# Altium footprint library Connector.PcbLib: 174 footprints (part 1 of 11)
Each footprint in its own frame and in the unit in brackets; x right, y up, seen from the top. Pads: shape width x height; smd on the part's side, far side on the other; paste and mask are expansions set on the pad; w line width, h text height; cw(c..) or ccw(c..) is an arc to the next point about the centre after c.
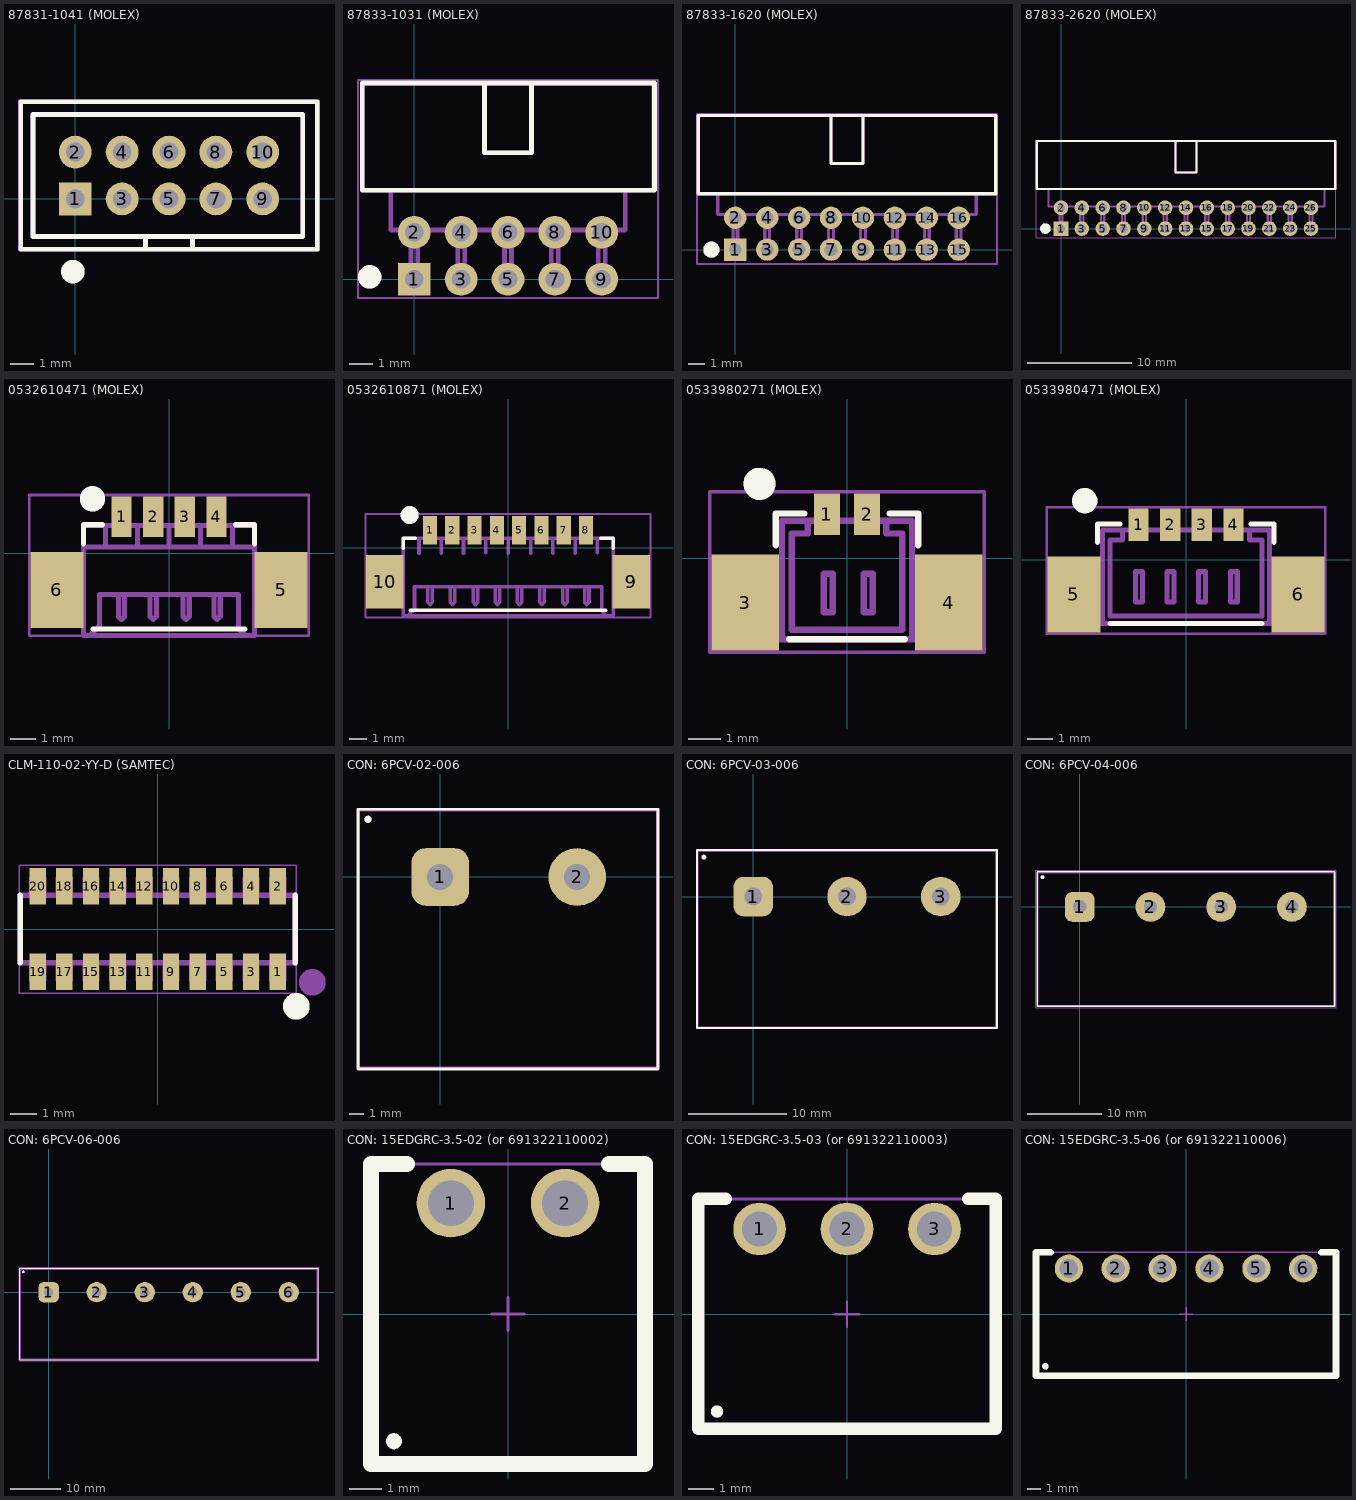
[diagram p0: the footprints below, top view; thin cyan lines are the x and y axes]

## 87831-1041 (MOLEX) [mm]
pads (10):
  rect 1.4x1.4 hole 0.8: 1(0,0)
  round 1.4 hole 0.8: 2(0,2) 3(2,0) 4(2,2) 5(4,0) 6(4,2) 7(6,0) 8(6,2) 9(8,0) 10(8,2)
Top Overlay:
  circle w0.5: c-0.1,-3.1 r0.25
  lines w0.2: 3,-2.1 3,-1.6 ; 5,-2.1 5,-1.6 ; -2.325,-2.15 10.325,-2.15 10.325,4.15 -2.325,4.15 -2.325,-2.15 ; -1.8,-1.6 -1.8,3.6 9.7,3.6 9.7,-1.6 -1.8,-1.6
Top Assy:
  circle w0.5: c-0.1,-3.1 r0.25
  lines w0.2: 3,-2.1 3,-1.6 -1.8,-1.6 -1.8,3.6 9.7,3.6 9.7,-1.6 5,-1.6 5,-2.1 ; -2.325,-2.15 -2.325,4.15 10.325,4.15 10.325,-2.15 -2.325,-2.15
  text "'.Designator'" at -2.3,4.4 h1
Area:
  lines w0.1: -2.4,-2.2 10.4,-2.2 10.4,4.2 -2.4,4.2 -2.4,-2.2
3D body "87831-1041.stp": height 6.2, standoff -2.7, extent -2.325,-2.15 10.325,4.15

## 87833-1031 (MOLEX) [mm]
pads (10):
  rect 1.4x1.4 hole 0.8: 1(0,0)
  round 1.4 hole 0.8: 2(0,2) 3(2,0) 4(2,2) 5(4,0) 6(4,2) 7(6,0) 8(6,2) 9(8,0) 10(8,2)
Top Overlay:
  circle w0.5: c-1.9,0.1 r0.25
  lines w0.2: 3,8.3 3,5.4 5,5.4 5,8.3 ; -2.225,3.8 10.25,3.8 10.25,8.375 -2.225,8.375 -2.225,3.8
Top Assy:
  circle w0.5: c-1.9,0.1 r0.25
  lines w0.2: -1,3.8 -1,2.1 9,2.1 9,3.8 ; -0.15,2.1 -0.15,0 0.15,0 0.15,2.1 ; 1.85,2.1 1.85,0 2.15,0 2.15,2.1 ; 3,8.3 3,5.4 5,5.4 5,8.3 ; 3.85,2.1 3.85,0 4.15,0 4.15,2.1 ; 5.85,2.1 5.85,0 6.15,0 6.15,2.1 ; 7.85,2.1 7.85,0 8.15,0 8.15,2.1 ; -2.225,3.8 10.225,3.8 10.225,8.375 -2.225,8.375 -2.225,3.8
  text "'.Designator'" at 1.5,4.3 h1
Area:
  lines w0.1: -2.4,-0.8 10.4,-0.8 10.4,8.5 -2.4,8.5 -2.4,-0.8
3D body "Molex 87833-1031.step": height 6.35, standoff -2.11, extent -2.325,-0.225 10.325,8.425

## 87833-1620 (MOLEX) [mm]
pads (16):
  rect 1.4x1.4 hole 0.8: 1(0,0)
  round 1.4 hole 0.8: 2(0,2) 3(2,0) 4(2,2) 5(4,0) 6(4,2) 7(6,0) 8(6,2) 9(8,0) 10(8,2) 11(10,0) 12(10,2) 13(12,0) 14(12,2) 15(14,0) 16(14,2)
Top Overlay:
  circle w0.5: c-1.5,0 r0.25
  lines w0.2: 6,8.3 6,5.4 8,5.4 8,8.3 ; -2.325,3.5 16.325,3.5 16.325,8.4 -2.325,8.4 -2.325,3.5
Top Assy:
  circle w0.5: c-1.5,0 r0.25
  lines w0.2: -1.1,3.5 -1.1,2.2 15.1,2.2 15.1,3.5 ; -0.15,2.1 -0.15,0 0.15,0 0.15,2.1 ; 1.85,2.1 1.85,0 2.15,0 2.15,2.1 ; 3.85,2.1 3.85,0 4.15,0 4.15,2.1 ; 5.85,2.1 5.85,0 6.15,0 6.15,2.1 ; 6,8.4 6,5.4 8,5.4 8,8.4 ; 7.85,2.1 7.85,0 8.15,0 8.15,2.1 ; 9.85,2.1 9.85,0 10.15,0 10.15,2.1 ; 11.85,2.1 11.85,0 12.15,0 12.15,2.1 ; 13.85,2.1 13.85,0 14.15,0 14.15,2.1 ; -2.325,3.5 -2.325,8.4 16.325,8.4 16.325,3.5 -2.325,3.5
  text "'.Designator'" at 4.6,3.9 h1
Area:
  lines w0.1: -2.4,-0.9 16.4,-0.9 16.4,8.5 -2.4,8.5 -2.4,-0.9
3D body "87833-1620.stp": height 6.25, standoff -2.21, extent -2.325,-0.32 16.325,8.33

## 87833-2620 (MOLEX) [mm]
pads (26):
  rect 1.4x1.4 hole 0.8: 1(0,0)
  round 1.4 hole 0.8: 2(0,2) 3(2,0) 4(2,2) 5(4,0) 6(4,2) 7(6,0) 8(6,2) 9(8,0) 10(8,2) 11(10,0) 12(10,2) 13(12,0) 14(12,2) 15(14,0) 16(14,2) 17(16,0) 18(16,2) 19(18,0) 20(18,2) 21(20,0) 22(20,2) 23(22,0) 24(22,2) 25(24,0) 26(24,2)
Top Overlay:
  circle w0.5: c-1.5,0 r0.25
  lines w0.2: 11,8.4 11,5.4 13,5.4 13,8.4 ; -2.325,3.8 -2.325,8.4 26.325,8.4 26.325,3.8 -2.325,3.8
Top Assy:
  circle w0.5: c-1.5,0 r0.25
  lines w0.2: -1.2,3.8 -1.2,2.1 25.3,2.1 25.3,3.8 ; -0.15,2.1 -0.15,0 0.15,0 0.15,2.1 ; 1.85,2.1 1.85,0 2.15,0 2.15,2.1 ; 3.85,2.1 3.85,0 4.15,0 4.15,2.1 ; 5.85,2.1 5.85,0 6.15,0 6.15,2.1 ; 7.85,2.1 7.85,0 8.15,0 8.15,2.1 ; 9.85,2.1 9.85,0 10.15,0 10.15,2.1 ; 11,8.3 11,5.4 13,5.4 13,8.3 ; 11.85,2.1 11.85,0 12.15,0 12.15,2.1 ; 13.85,2.1 13.85,0 14.15,0 14.15,2.1 ; 15.85,2.1 15.85,0 16.15,0 16.15,2.1 ; 17.85,2.1 17.85,0 18.15,0 18.15,2.1 ; 19.85,2.1 19.85,0 20.15,0 20.15,2.1 ; 21.85,2.1 21.85,0 22.15,0 22.15,2.1 ; 23.85,2.1 23.85,0 24.15,0 24.15,2.1 ; -2.325,3.8 26.325,3.8 26.325,8.4 -2.325,8.4 -2.325,3.8
  text "'.Designator'" at 9.6,4.2 h1
Area:
  lines w0.05: -2.4,-0.9 -2.4,8.5 26.4,8.5 26.4,-0.9 -2.4,-0.9
3D body "Molex 87833-2620.step": height 6.35, standoff -2.11, extent -2.325,-0.25 26.325,8.4

## 0532610471 (MOLEX) [mm] "1.25mm Pitch, PicoBlade PCB Header, Single Row, Horizontal, Surface Mount, Tin (Sn) Plating, Friction Lock, 4 Circuits"
pads (6):
  rect 0.8x1.6 smd: 1(-1.875,1.45) 2(-0.625,1.45) 3(0.625,1.45) 4(1.875,1.45)
  rect 2.1x3 smd: 5(4.425,-1.45) 6(-4.425,-1.45)
Top Overlay:
  circle w0.5: c-3.025,2.15 r0.25
  lines w0.2: -3.375,0.375 -3.375,1.125 -2.625,1.125 ; -3,-3 3,-3 ; 2.625,1.125 3.375,1.125 3.375,0.375
Top Assy:
  circle w0.5: c-3.025,2.15 r0.25
  lines w0.2: -3.4,-2.75 -5,-2.75 -5,-0.15 -3.4,-0.15 ; -3.375,0.25 3.375,0.25 ; -3.125,-3.25 -2.75,-2.875 -2.75,-1.625 2.75,-1.625 2.75,-2.875 2.75,-3 3,-3.25 ; -2.5,0.275 -2.5,1.1 ; -2.125,1.125 -2.125,1.825 -1.625,1.825 -1.625,1.125 ; -2,-1.65 -2,-2.5 -1.875,-2.625 -1.75,-2.5 -1.75,-1.65 ; -1.25,0.25 -1.25,1.075 ; -0.875,1.1 -0.875,1.8 -0.375,1.8 -0.375,1.1 ; -0.75,-1.65 -0.75,-2.5 -0.625,-2.625 -0.5,-2.5 -0.5,-1.65 ; 0,0.25 0,1.1 ; 0.375,1.1 0.375,1.8 0.875,1.8 0.875,1.1 ; 0.55,-1.65 0.55,-2.5 0.675,-2.625 0.8,-2.5 0.8,-1.65 ; 1.25,0.276 1.25,1.1 ; 1.625,1.1 1.625,1.8 2.125,1.8 2.125,1.1 ; 1.775,-1.65 1.775,-2.5 1.9,-2.625 2.025,-2.5 2.025,-1.65 ; 2.5,0.275 2.5,1.075 ; 3.375,-2.75 4.975,-2.75 4.975,-0.15 3.375,-0.15 ; -3.375,-3.25 3.375,-3.25 3.375,1.1 -3.375,1.1 -3.375,-3.25
  text "'.Designator'" at -0.9,-1.2 h1
Area:
  lines w0.1: -5.525,-3.25 -5.525,2.3 5.525,2.3 5.525,-3.25 -5.525,-3.25
3D body "53261-0471.stp": height 3.4, standoff 0, extent -5.1,-3.325 5.05,1.875

## 0532610871 (MOLEX) [mm] "1.25mm Pitch, PicoBlade PCB Header, Single Row, Horizontal, Surface Mount, Tin (Sn) Plating, Friction Lock, 8 Circuits"
pads (10):
  rect 0.8x1.6 smd: 1(-4.375,1.004) 2(-3.125,1.004) 3(-1.875,1.004) 4(-0.625,1.004) 5(0.625,1.004) 6(1.875,1.004) 7(3.125,1.004) 8(4.375,1.004)
  rect 2.1x3 smd: 9(6.925,-1.896) 10(-6.925,-1.896)
Top Overlay:
  circle w0.5: c-5.525,1.85 r0.25
  lines w0.2: -5.884,0 -5.884,0.547 -5.203,0.547 ; -5.5,-3.5 5.5,-3.5 ; 5.204,0.554 5.9,0.554 5.9,0
Top Assy:
  circle w0.5: c-5.525,1.85 r0.25
  circle w0.5: c-5.525,1.85 r0.25
  lines w0.2: -5.9,-3.007 -7.5,-3.007 -7.5,-0.8 -5.9,-0.8 ; -5.625,-3.8 -5.25,-3.425 -5.25,-2.175 5.275,-2.175 5.275,-3.55 5.525,-3.8 ; -5,-0.3 -5,0.55 ; -4.625,0.575 -4.625,1.275 -4.125,1.275 -4.125,0.575 ; -4.5,-2.2 -4.5,-3.05 -4.375,-3.175 -4.25,-3.05 -4.25,-2.2 ; -3.75,-0.3 -3.75,0.525 ; -3.375,0.55 -3.375,1.25 -2.875,1.25 -2.875,0.55 ; -3.25,-2.2 -3.25,-3.05 -3.125,-3.175 -3,-3.05 -3,-2.2 ; -2.5,-0.3 -2.5,0.55 ; -2.125,0.55 -2.125,1.25 -1.625,1.25 -1.625,0.55 ; -1.95,-2.2 -1.95,-3.05 -1.825,-3.175 -1.7,-3.05 -1.7,-2.2 ; -1.25,-0.275 -1.25,0.55 ; -0.875,0.55 -0.875,1.25 -0.375,1.25 -0.375,0.55 ; -0.725,-2.2 -0.725,-3.05 -0.6,-3.175 -0.475,-3.05 -0.475,-2.2 ; 0.025,-0.3 0.025,0.55 ; 0.4,0.575 0.4,1.275 0.9,1.275 0.9,0.575 ; 0.525,-2.2 0.525,-3.05 0.65,-3.175 0.775,-3.05 0.775,-2.2 ; 1.275,-0.3 1.275,0.525 ; 1.65,0.55 1.65,1.25 2.15,1.25 2.15,0.55 ; 1.775,-2.2 1.775,-3.05 1.9,-3.175 2.025,-3.05 2.025,-2.2 ; 2.525,-0.3 2.525,0.55 ; 2.9,0.55 2.9,1.25 3.4,1.25 3.4,0.55 ; 3.075,-2.2 3.075,-3.05 3.2,-3.175 3.325,-3.05 3.325,-2.2 ; 3.775,-0.3 3.775,0.55 ; 4.15,0.55 4.15,1.25 4.65,1.25 4.65,0.55 ; 4.3,-2.2 4.3,-3.05 4.425,-3.175 4.55,-3.05 4.55,-2.2 ; 5.025,-0.275 5.025,0.525 ; 5.9,-3.008 7.5,-3.008 7.5,-0.8 5.9,-0.8 ; -5.875,-3.8 -5.875,0.55 5.9,0.55 5.9,-3.8 -5.875,-3.8
  text "'.Designator'" at -0.9,-1.5 h1
Area:
  lines w0.1: -8,-3.9 -8,1.913 8,1.913 8,-3.9 -8,-3.9
3D body "0532610871.stp": height 3.4, standoff 0, extent -7.575,-3.895 7.575,1.305

## 0533980271 (MOLEX) [mm] "1.25mm Pitch, PicoBlade PCB Header, Single Row, Vertical, Surface Mount, Tin (Sn) Plating, Friction Lock, 2 Circuits"
pads (4):
  rect 0.8x1.3 smd: 1(-0.625,1.375) 2(0.625,1.375)
  rect 2.1x3 smd: 3(-3.175,-1.375) 4(3.175,-1.375)
Top Overlay:
  circle w0.5: c-2.725,2.325 r0.25
  lines w0.2: -2.225,0.414 -2.225,1.4 -1.337,1.4 ; -1.8,-2.525 1.8,-2.525 ; 1.337,1.4 2.225,1.4 2.225,0.414
Top Assy:
  circle w0.5: c-2.725,2.325 r0.25
  lines w0.2: -3.625,-0.15 -3.625,-2.525 -2.025,-2.525 ; -3.625,-0.1 -2.025,-0.1 ; -1.225,1.175 -1.225,0.775 -1.725,0.775 -1.725,-2.225 1.725,-2.225 1.725,0.775 1.225,0.775 1.225,1.175 ; -0.875,1.175 -0.875,1.875 -0.375,1.875 -0.375,1.175 ; 0.4,1.175 0.4,1.875 0.85,1.875 0.85,1.175 ; 2.025,-0.1 3.6,-0.1 3.6,-2.525 2.025,-2.525 ; -2.025,-2.525 -2.025,1.175 2.025,1.175 2.025,-2.525 ; -2.025,-2.525 2.025,-2.525 ; -0.725,-1.675 -0.725,-0.475 -0.45,-0.475 -0.45,-1.675 -0.725,-1.675 ; 0.525,-1.675 0.525,-0.475 0.8,-0.475 0.8,-1.675 0.525,-1.675
  text "'.Designator'" at -2,-3.825 h1
Area:
  lines w0.1: -4.275,-2.925 -4.275,2.075 4.275,2.075 4.275,-2.925 -4.275,-2.925
3D body "0533980271.stp": height 4.7, standoff 0, extent -3.825,-2.435 3.825,1.765

## 0533980471 (MOLEX) [mm] "1.25mm Pitch, PicoBlade PCB Header, Single Row, Vertical, Surface Mount, Tin (Sn) Plating, Friction Lock, 4 Circuits"
pads (6):
  rect 0.8x1.3 smd: 1(-1.875,1.375) 2(-0.625,1.375) 3(0.625,1.375) 4(1.875,1.375)
  rect 2.1x3 smd: 5(-4.425,-1.375) 6(4.425,-1.375)
Top Overlay:
  circle w0.5: c-4,2.325 r0.25
  lines w0.2: -3.5,0.675 -3.5,1.4 -2.6,1.4 ; -3,-2.525 3,-2.525 ; 2.575,1.4 3.475,1.4 3.475,0.675
Top Assy:
  circle w0.5: c-4,2.325 r0.25
  lines w0.2: -2.5,1.175 -2.5,0.775 -3,0.775 -3,-2.225 3,-2.225 3,0.775 2.5,0.775 2.5,1.175 ; -2.1,1.175 -2.1,1.875 -1.6,1.875 -1.6,1.175 ; -0.85,1.175 -0.85,1.875 -0.35,1.875 -0.35,1.175 ; 0.4,1.175 0.4,1.875 0.9,1.875 0.9,1.175 ; 1.65,1.175 1.65,1.875 2.15,1.875 2.15,1.175 ; 3.3,-2.525 3.3,-0.1 4.875,-0.1 4.875,-2.525 -3.3,-2.525 ; 3.3,-0.95 3.3,1.175 -3.3,1.175 -3.3,-2.525 ; -3.3,-2.525 -3.3,-0.1 -4.9,-0.1 -4.9,-2.525 -3.3,-2.525 ; -2,-1.675 -2,-0.475 -1.725,-0.475 -1.725,-1.675 -2,-1.675 ; -0.75,-1.675 -0.475,-1.675 -0.475,-0.475 -0.75,-0.475 -0.75,-1.675 ; 0.5,-1.675 0.775,-1.675 0.775,-0.475 0.5,-0.475 0.5,-1.675 ; 1.75,-1.675 2.025,-1.675 2.025,-0.475 1.75,-0.475 1.75,-1.675
  text "'.Designator'" at -2,-3.825 h1
Area:
  lines w0.1: -5.5,-2.925 -5.5,2.075 5.5,2.075 5.5,-2.925 -5.5,-2.925
3D body "53398-0471.stp": height 4.7, standoff 0, extent -5.075,-2.6 5.075,1.6

## CLM-110-02-YY-D (SAMTEC) [mm]
pads (20):
  rect 0.61x1.37 smd: 1(4.5,-1.601) 2(4.5,1.601) 3(3.5,-1.601) 4(3.5,1.601) 5(2.5,-1.601) 6(2.5,1.601) 7(1.5,-1.601) 8(1.5,1.601) 9(0.5,-1.601) 10(0.5,1.601) 11(-0.5,-1.601) 12(-0.5,1.601) 13(-1.5,-1.601) 14(-1.5,1.601) 15(-2.5,-1.601) 16(-2.5,1.601) 17(-3.5,-1.601) 18(-3.5,1.601) 19(-4.5,-1.601) 20(-4.5,1.601)
Top Overlay:
  circle w0.5: c5.2,-2.9 r0.25
  lines w0.2: -5.159,-1.27 -5.159,1.27 ; 5.159,-1.27 5.159,1.27
Top Assy:
  circle w0.5: c5.8,-2 r0.25
  lines w0.2: -5.159,-1.27 5.159,-1.27 5.159,1.27 -5.159,1.27 -5.159,-1.27
  lines w0.254: -4.7,-1.3 -4.7,-1.9 -4.3,-1.9 -4.3,-1.3 ; -4.7,1.3 -4.7,1.9 -4.3,1.9 -4.3,1.3 ; -3.7,-1.3 -3.7,-1.9 -3.3,-1.9 -3.3,-1.3 ; -3.7,1.3 -3.7,1.9 -3.3,1.9 -3.3,1.3 ; -2.7,-1.3 -2.7,-1.9 -2.3,-1.9 -2.3,-1.3 ; -2.7,1.3 -2.7,1.9 -2.3,1.9 -2.3,1.3 ; -1.7,-1.3 -1.7,-1.9 -1.3,-1.9 -1.3,-1.3 ; -1.7,1.3 -1.7,1.9 -1.3,1.9 -1.3,1.3 ; -0.7,-1.3 -0.7,-1.9 -0.3,-1.9 -0.3,-1.3 ; -0.7,1.3 -0.7,1.9 -0.3,1.9 -0.3,1.3 ; 0.3,-1.3 0.3,-1.9 0.7,-1.9 0.7,-1.3 ; 0.3,1.3 0.3,1.9 0.7,1.9 0.7,1.3 ; 1.3,-1.3 1.3,-1.9 1.7,-1.9 1.7,-1.3 ; 1.3,1.3 1.3,1.9 1.7,1.9 1.7,1.3 ; 2.3,-1.3 2.3,-1.9 2.7,-1.9 2.7,-1.3 ; 2.3,1.3 2.3,1.9 2.7,1.9 2.7,1.3 ; 3.3,-1.3 3.3,-1.9 3.7,-1.9 3.7,-1.3 ; 3.3,1.3 3.3,1.9 3.7,1.9 3.7,1.3 ; 4.3,-1.3 4.3,-1.9 4.7,-1.9 4.7,-1.3 ; 4.3,1.3 4.3,1.9 4.7,1.9 4.7,1.3
  text "'.Designator'" at -2.1,-0.2 h1
Area:
  lines w0.05: -5.2,-2.4 5.2,-2.4 5.2,2.4 -5.2,2.4 -5.2,-2.4
3D body "CLM-110-02-L-D.stp": height 2.25, standoff 0, extent -5.161,-1.905 5.156,1.905

## CON: 6PCV-02-006 [mm]
pads (4):
  rrect50% 4x4 hole 1.8: 1(0,0)
  round 4 hole 1.8: 2(9.5,0)
  round 0.5 on Mech1: ""(-5,4)
  round 0.5 on Top Overlay: ""(-5,4)
Top Overlay:
  lines w0.2: -5.7,-13.3 -5.7,4.7 15.1,4.7 15.1,-13.3 -5.7,-13.3
Top Assy:
  lines w0.1: -5.6,-13.2 -5.6,4.58 15,4.58 15,-13.2 -5.6,-13.2
  text "2" at 9.2,-3.6 h2
  text "1" at -0.2,-3.6 h2
Area:
  lines w0.1: -5.7,-13.3 15.1,-13.3 15.1,4.7 -5.7,4.7 -5.7,-13.3
3D body "02.STEP": height 15.96, standoff -4.99, extent -5.6,-13.2 15,4.58

## CON: 6PCV-03-006 [mm]
pads (4):
  rrect50% 4x4 hole 1.8: 1(0,0)
  round 4 hole 1.8: 2(9.5,0) 3(19,0)
  round 0.5 on Top Overlay: ""(-5,4)
Top Overlay:
  lines w0.2: -5.7,-13.3 24.7,-13.3 24.7,4.7 -5.7,4.7 -5.7,-13.3
Top Assy:
  lines w0.1: -5.562,-13.2 24.562,-13.2 24.562,4.58 -5.562,4.58 -5.562,-13.2
  text "3" at 18.8,-3.6 h2
  text "2" at 9.2,-3.6 h2
  text "1" at -0.2,-3.6 h2
Area:
  lines w0.1: -5.675,-13.3 24.675,-13.3 24.675,4.675 -5.675,4.675 -5.675,-13.3
3D body "03.STEP": height 15.96, standoff -4.99, extent -5.562,-13.2 24.562,4.58

## CON: 6PCV-04-006 [mm]
pads (6):
  rrect50% 4x4 hole 1.8: 1(0,0)
  round 4 hole 1.8: 2(9.5,0) 3(19,0) 4(28.5,0)
  round 0.5 on Mech1: ""(-5,4)
  round 0.5 on Top Overlay: ""(-5,4)
Top Overlay:
  lines w0.2: -5.7,-13.35 -5.7,4.725 34.25,4.725 34.25,-13.35 -5.7,-13.35
Top Assy:
  lines w0.1: -5.55,-13.2 -5.55,4.58 34.1,4.58 34.1,-13.2 -5.55,-13.2
  text "1" at -0.2,-3.6 h2
  text "2" at 9.2,-3.6 h2
  text "3" at 18.8,-3.6 h2
  text "4" at 28.2,-3.6 h2
Area:
  lines w0.1: -5.875,-13.525 -5.875,4.9 34.425,4.9 34.425,-13.525 -5.875,-13.525
3D body "6pcv-04-006.STEP": height 15.96, standoff -4.99, extent -5.525,-13.18 34.125,4.6

## CON: 6PCV-06-006 [mm]
pads (8):
  rrect50% 4x4 hole 1.8: 1(0,0)
  round 4 hole 1.8: 2(9.5,0) 3(19,0) 4(28.5,0) 5(38,0) 6(47.5,0)
  round 0.5 on Mech1: ""(-5,4)
  round 0.5 on Top Overlay: ""(-5,4)
Top Overlay:
  lines w0.2: -5.7,-13.35 -5.7,4.725 53.3,4.725 53.3,-13.35 -5.7,-13.35
Top Assy:
  lines w0.1: -5.55,-13.2 -5.55,4.58 53.15,4.58 53.15,-13.2 -5.55,-13.2
  text "1" at -0.2,-3.6 h2
  text "2" at 9.2,-3.6 h2
  text "3" at 18.8,-3.6 h2
  text "4" at 28.2,-3.6 h2
  text "5" at 37.7,-3.6 h2
  text "6" at 47.2,-3.5 h2
Area:
  lines w0.1: -5.875,-13.525 -5.875,4.9 53.475,4.9 53.475,-13.525 -5.875,-13.525
3D body "6pcv-06-006.STEP": height 15.96, standoff -4.99, extent -5.55,-13.2 53.15,4.58

## CON: 15EDGRC-3.5-02 (or 691322110002) [mm] "Horizontal PCB Header, pitch 3.5mm, 02p"
height 7
pads (3):
  round 2.1 hole 1.4: 1(-1.75,3.4) 2(1.75,3.4)
  round 0.5 on Top Overlay: ""(-3.5,-3.9)
Top Overlay:
  lines w0.5: -3.1,4.6 -4.2,4.6 -4.2,-4.6 4.2,-4.6 4.2,4.6 3.1,4.6
3D view:
  lines w0.1: -4.2,-4.6 -4.2,4.6 4.2,4.6 4.2,-4.6 -4.2,-4.6
Area:
  lines w0.1: -0.5,0 0.5,0 ; 0,-0.5 0,0.5 ; -4.2,-4.6 -4.2,4.6 -2.2,4.6 2.2,4.6 4.2,4.6 4.2,-4.6 -4.2,-4.6
3D body "691322110002.stp": height 7.3, standoff -3.4, extent -4.2,-4.6 4.2,4.6

## CON: 15EDGRC-3.5-03 (or 691322110003) [mm] "Horizontal PCB Header, pitch 3.5mm, 03p"
height 7
pads (4):
  round 2.1 hole 1.4: 1(-3.5,3.4) 2(0,3.4) 3(3.5,3.4)
  round 0.5 on Top Overlay: ""(-5.2,-3.9)
Top Overlay:
  lines w0.5: -4.85,4.6 -5.95,4.6 -5.95,-4.6 5.95,-4.6 5.95,4.6 4.85,4.6
3D view:
  lines w0.1: -5.95,-4.6 5.95,-4.6 5.95,4.6 -5.95,4.6 -5.95,-4.6
Area:
  lines w0.1: -0.5,0 0.5,0 ; 0,-0.5 0,0.5 ; -6,-4.6 6,-4.6 6,4.6 -6,4.6 -6,-4.6
3D body "691322110003.stp": height 7.3, standoff -3.4, extent -5.95,-4.6 5.95,4.6

## CON: 15EDGRC-3.5-06 (or 691322110006) [mm] "Horizontal PCB Header, pitch 3.5mm, 06p"
height 7
pads (7):
  round 2.1 hole 1.4: 1(-8.75,3.4) 2(-5.25,3.4) 3(-1.75,3.4) 4(1.75,3.4) 5(5.25,3.4) 6(8.75,3.4)
  round 0.5 on Top Overlay: ""(-10.5,-3.9)
Top Overlay:
  lines w0.5: -10.1,4.6 -11.2,4.6 -11.2,-4.6 11.2,-4.6 11.2,4.6 10.1,4.6
3D view:
  lines w0.1: -11.2,-4.6 11.2,-4.6 11.2,4.6 -11.2,4.6 -11.2,-4.6
Area:
  lines w0.1: -0.5,0 0.5,0 ; 0,-0.5 0,0.5 ; -11.2,-4.6 11.2,-4.6 11.2,4.6 -11.2,4.6 -11.2,-4.6
3D body "691322110006.stp": height 7.3, standoff -3.4, extent -11.2,-4.6 11.2,4.6